# Altium schematic symbol library Capacitor - Ceramic - Sumsung.SchLib: 1421 symbols (part 3 of 8) (continued)
## CL10B561KC8WPNC (continued)
CAP CER 560PF 100V X7R 0603; Part Number: CL10B561KC8WPNC; Manufacturer: Samsung Electro-Mechanics; TemperatureRange: -55C ~ 125C; Tolerance: 10%; Value: 560pF; PartId: 30235; Supplier 1: Digi-Key; Supplier Part Number 1: 1276-6657-2-ND; ComponentLink1Description: Datasheet; ComponentLink1URL: http://www.samsungsem.com/kr/support/library/product-catalog/mlcc.jsp; ComponentLink2Description: Digi-Key Listing; ComponentLink2URL: https://www.digikey.com/product-detail/en/samsung-electro-mechanics/CL10B561KC8WPNC/1276-6657-2-ND/5961141; TemperatureCoefficient: X7R; Voltage: 100V; Price: 0; Device Package: 0603 (1608 Metric)
footprint CAP 0603/1608
pins: 1, 2

## CL10B562JB8NNNC
designator C?, comment 5600pF
CAP CER 5600PF 50V X7R 0603; Part Number: CL10B562JB8NNNC; Manufacturer: Samsung Electro-Mechanics America, Inc.; TemperatureRange: -55C ~ 125C; Tolerance: 5%; Value: 5600pF; PartId: 5537; Supplier 1: Digi-Key; Supplier Part Number 1: 1276-2090-2-ND; ComponentLink1Description: Datasheet; ComponentLink1URL: http://www.samsungsem.com/kr/support/product-search/mlcc/CL10B562JB8NNNC.jsp; ComponentLink2Description: Digi-Key listing; ComponentLink2URL: http://digikey.com/product-detail/en/CL10B562JB8NNNC/1276-2090-2-ND/3887748; TemperatureCoefficient: X7R; Voltage: 50V; Price: 0.0243; Type: -; Device Package: 0603 (1608 Metric)
footprint CAP 0603/1608
pins: 1, 2

## CL10B562KB8NNNC
designator C?, comment 5600pF
CAP CER 5600PF 50V X7R 0603; Part Number: CL10B562KB8NNNC; Manufacturer: Samsung Electro-Mechanics America, Inc.; TemperatureRange: -55C ~ 125C; Tolerance: 10%; Value: 5600pF; PartId: 5353; Supplier 1: Digi-Key; Supplier Part Number 1: 1276-2091-2-ND; ComponentLink1Description: Datasheet; ComponentLink1URL: http://www.samsungsem.com/kr/support/product-search/mlcc/CL10B562KB8NNNC.jsp; ComponentLink2Description: Digi-Key listing; ComponentLink2URL: http://digikey.com/product-detail/en/CL10B562KB8NNNC/1276-2091-2-ND/3887749; TemperatureCoefficient: X7R; Voltage: 50V; Price: 0.0097; Type: -; Device Package: 0603 (1608 Metric)
footprint CAP 0603/1608
pins: 1, 2

## CL10B563KA8NNNC
designator C?, comment 0.056uF
CAP CER 0.056UF 25V X7R 0603; Part Number: CL10B563KA8NNNC; Manufacturer: Samsung Electro-Mechanics America, Inc.; TemperatureRange: -55C ~ 125C; Tolerance: 10%; Value: 0.056uF; PartId: 5533; Supplier 1: Digi-Key; Supplier Part Number 1: 1276-2094-2-ND; ComponentLink1Description: Datasheet; ComponentLink1URL: http://www.samsungsem.com/kr/support/product-search/mlcc/CL10B563KA8NNNC.jsp; ComponentLink2Description: Digi-Key listing; ComponentLink2URL: http://digikey.com/product-detail/en/CL10B563KA8NNNC/1276-2094-2-ND/3887752; TemperatureCoefficient: X7R; Voltage: 25V; Price: 0.0239; Type: -; Device Package: 0603 (1608 Metric)
footprint CAP 0603/1608
pins: 1, 2

## CL10B563KB8NNNC
designator C?, comment 0.056uF
CAP CER 0.056UF 50V X7R 0603; Part Number: CL10B563KB8NNNC; Manufacturer: Samsung Electro-Mechanics America, Inc.; TemperatureRange: -55C ~ 125C; Tolerance: 10%; Value: 0.056uF; PartId: 5534; Supplier 1: Digi-Key; Supplier Part Number 1: 1276-2096-2-ND; ComponentLink1Description: Datasheet; ComponentLink1URL: http://www.samsungsem.com/kr/support/product-search/mlcc/CL10B563KB8NNNC.jsp; ComponentLink2Description: Digi-Key listing; ComponentLink2URL: http://digikey.com/product-detail/en/CL10B563KB8NNNC/1276-2096-2-ND/3887754; TemperatureCoefficient: X7R; Voltage: 50V; Price: 0.0239; Type: -; Device Package: 0603 (1608 Metric)
footprint CAP 0603/1608
pins: 1, 2

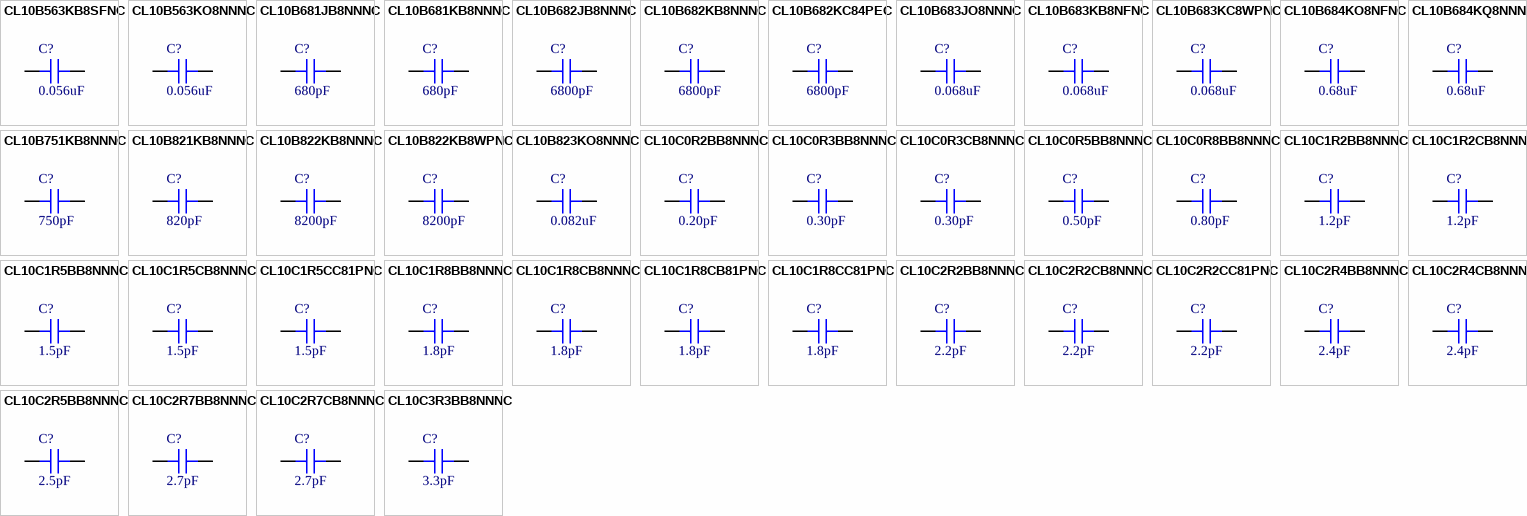
[diagram p11: symbols CL10B563KB8SFNC to CL10C3R3BB8NNNC]

## CL10B563KB8SFNC
designator C?, comment 0.056uF
CAP CER 0.056UF 50V X7R 0603; Part Number: CL10B563KB8SFNC; Manufacturer: Samsung Electro-Mechanics America, Inc.; TemperatureRange: -55C ~ 125C; Tolerance: 10%; Value: 0.056uF; PartId: 13452; Supplier 1: Digi-Key; Supplier Part Number 1: 1276-2097-2-ND; ComponentLink1Description: Datasheet; ComponentLink1URL: http://www.samsungsem.com/kr/support/product-search/mlcc/CL10B563KB8SFNC.jsp; ComponentLink2Description: Digi-Key Listing; ComponentLink2URL: https://www.digikey.com/product-detail/en/samsung-electro-mechanics-america-inc/CL10B563KB8SFNC/1276-2097-2-ND/3887755; TemperatureCoefficient: X7R; Voltage: 50V; Price: 0.0225; Device Package: 0603 (1608 Metric)
footprint CAP 0603/1608
pins: 1, 2

## CL10B563KO8NNNC
designator C?, comment 0.056uF
CAP CER 0.056UF 16V X7R 0603; Part Number: CL10B563KO8NNNC; Manufacturer: Samsung Electro-Mechanics America, Inc.; TemperatureRange: -55C ~ 125C; Tolerance: 10%; Value: 0.056uF; PartId: 5535; Supplier 1: Digi-Key; Supplier Part Number 1: 1276-2098-2-ND; ComponentLink1Description: Datasheet; ComponentLink1URL: http://www.samsungsem.com/kr/support/product-search/mlcc/CL10B563KO8NNNC.jsp; ComponentLink2Description: Digi-Key listing; ComponentLink2URL: http://digikey.com/product-detail/en/CL10B563KO8NNNC/1276-2098-2-ND/3887756; TemperatureCoefficient: X7R; Voltage: 16V; Price: 0.0239; Type: -; Device Package: 0603 (1608 Metric)
footprint CAP 0603/1608
pins: 1, 2

## CL10B681JB8NNNC
designator C?, comment 680pF
CAP CER 680PF 50V X7R 0603; Part Number: CL10B681JB8NNNC; Manufacturer: Samsung Electro-Mechanics America, Inc.; TemperatureRange: -55C ~ 125C; Tolerance: 5%; Value: 680pF; PartId: 5449; Supplier 1: Digi-Key; Supplier Part Number 1: 1276-1279-2-ND; ComponentLink1Description: Datasheet; ComponentLink1URL: http://www.samsungsem.com/kr/support/product-search/mlcc/CL10B681JB8NNNC.jsp; ComponentLink2Description: Digi-Key listing; ComponentLink2URL: http://digikey.com/product-detail/en/CL10B681JB8NNNC/1276-1279-2-ND/3886937; TemperatureCoefficient: X7R; Voltage: 50V; Price: 0.0153; Type: -; Device Package: 0603 (1608 Metric)
footprint CAP 0603/1608
pins: 1, 2

## CL10B681KB8NNNC
designator C?, comment 680pF
CAP CER 680PF 50V X7R 0603; Part Number: CL10B681KB8NNNC; Manufacturer: Samsung Electro-Mechanics America, Inc.; TemperatureRange: -55C ~ 125C; Tolerance: 10%; Value: 680pF; PartId: 5326; Supplier 1: Digi-Key; Supplier Part Number 1: 1276-1080-2-ND; ComponentLink1Description: Datasheet; ComponentLink1URL: http://www.samsungsem.com/kr/support/product-search/mlcc/CL10B681KB8NNNC.jsp; ComponentLink2Description: Digi-Key listing; ComponentLink2URL: http://digikey.com/product-detail/en/CL10B681KB8NNNC/1276-1080-2-ND/3886738; TemperatureCoefficient: X7R; Voltage: 50V; Price: 0.0086; Type: -; Device Package: 0603 (1608 Metric)
footprint CAP 0603/1608
pins: 1, 2

## CL10B682JB8NNNC
designator C?, comment 6800pF
CAP CER 6800PF 50V X7R 0603; Part Number: CL10B682JB8NNNC; Manufacturer: Samsung Electro-Mechanics America, Inc.; TemperatureRange: -55C ~ 125C; Tolerance: 5%; Value: 6800pF; PartId: 5415; Supplier 1: Digi-Key; Supplier Part Number 1: 1276-2099-2-ND; ComponentLink1Description: Datasheet; ComponentLink1URL: http://www.samsungsem.com/kr/support/product-search/mlcc/CL10B682JB8NNNC.jsp; ComponentLink2Description: Digi-Key listing; ComponentLink2URL: http://digikey.com/product-detail/en/CL10B682JB8NNNC/1276-2099-2-ND/3887757; TemperatureCoefficient: X7R; Voltage: 50V; Price: 0.013; Type: -; Device Package: 0603 (1608 Metric)
footprint CAP 0603/1608
pins: 1, 2

## CL10B682KB8NNNC
designator C?, comment 6800pF
CAP CER 6800PF 50V X7R 0603; Part Number: CL10B682KB8NNNC; Manufacturer: Samsung Electro-Mechanics America, Inc.; TemperatureRange: -55C ~ 125C; Tolerance: 10%; Value: 6800pF; PartId: 5344; Supplier 1: Digi-Key; Supplier Part Number 1: 1276-1185-2-ND; ComponentLink1Description: Datasheet; ComponentLink1URL: http://www.samsungsem.com/kr/support/product-search/mlcc/CL10B682KB8NNNC.jsp; ComponentLink2Description: Digi-Key listing; ComponentLink2URL: http://digikey.com/product-detail/en/CL10B682KB8NNNC/1276-1185-2-ND/3886843; TemperatureCoefficient: X7R; Voltage: 50V; Price: 0.0097; Type: -; Device Package: 0603 (1608 Metric)
footprint CAP 0603/1608
pins: 1, 2

## CL10B682KC84PEC
designator C?, comment 6800pF
CAP CER 6800PF 100V X7R 0603; Part Number: CL10B682KC84PEC; Manufacturer: Samsung Electro-Mechanics; TemperatureRange: -55C ~ 125C; Tolerance: 10%; Value: 6800pF; PartId: 30453; Supplier 1: Digi-Key; Supplier Part Number 1: 1276-6548-2-ND; ComponentLink1Description: Datasheet; ComponentLink1URL: http://www.samsungsem.com/kr/support/library/product-catalog/mlcc.jsp; ComponentLink2Description: Digi-Key Listing; ComponentLink2URL: https://www.digikey.com/product-detail/en/samsung-electro-mechanics/CL10B682KC84PEC/1276-6548-2-ND/5961032; TemperatureCoefficient: X7R; Voltage: 100V; Price: 0; Device Package: 0603 (1608 Metric)
footprint CAP 0603/1608
pins: 1, 2

## CL10B683JO8NNNC
designator C?, comment 0.068uF
CAP CER 0.068UF 16V X7R 0603; Part Number: CL10B683JO8NNNC; Manufacturer: Samsung Electro-Mechanics America, Inc.; TemperatureRange: -55C ~ 125C; Tolerance: 5%; Value: 0.068uF; PartId: 5599; Supplier 1: Digi-Key; Supplier Part Number 1: 1276-2104-2-ND; ComponentLink1Description: Datasheet; ComponentLink1URL: http://media.digikey.com/pdf/Data%20Sheets/Samsung%20PDFs/CL10B683JO8NNNC_spec.pdf; ComponentLink2Description: Digi-Key listing; ComponentLink2URL: http://digikey.com/product-detail/en/CL10B683JO8NNNC/1276-2104-2-ND/3887762; TemperatureCoefficient: X7R; Voltage: 16V; Price: 0.0324; Type: -; Device Package: 0603 (1608 Metric)
footprint CAP 0603/1608
pins: 1, 2

## CL10B683KB8NFNC
designator C?, comment 0.068uF
CAP CER 0.068UF 50V X7R 0603; Part Number: CL10B683KB8NFNC; Manufacturer: Samsung Electro-Mechanics; TemperatureRange: -55C ~ 125C; Tolerance: 10%; Value: 0.068uF; PartId: 30368; Supplier 1: Digi-Key; Supplier Part Number 1: 1276-2108-2-ND; ComponentLink1Description: Datasheet; ComponentLink1URL: http://www.samsungsem.com/kr/support/product-search/mlcc/CL10B683KB8NFNC.jsp; ComponentLink2Description: Digi-Key Listing; ComponentLink2URL: https://www.digikey.com/product-detail/en/samsung-electro-mechanics/CL10B683KB8NFNC/1276-2108-2-ND/3887766; TemperatureCoefficient: X7R; Voltage: 50V; Price: 0; Device Package: 0603 (1608 Metric)
footprint CAP 0603/1608
pins: 1, 2

## CL10B683KC8WPNC
designator C?, comment 0.068uF
CAP CER 0.068UF 100V X7R 0603; Part Number: CL10B683KC8WPNC; Manufacturer: Samsung Electro-Mechanics; TemperatureRange: -55C ~ 125C; Tolerance: 10%; Value: 0.068uF; PartId: 30727; Supplier 1: Digi-Key; Supplier Part Number 1: 1276-6682-2-ND; ComponentLink1Description: Datasheet; ComponentLink1URL: http://www.samsungsem.com/kr/support/product-search/mlcc/CL10B683KC8WPNC.jsp; ComponentLink2Description: Digi-Key Listing; ComponentLink2URL: https://www.digikey.com/product-detail/en/samsung-electro-mechanics/CL10B683KC8WPNC/1276-6682-2-ND/5961166; TemperatureCoefficient: X7R; Voltage: 100V; Price: 0; Device Package: 0603 (1608 Metric)
footprint CAP 0603/1608
pins: 1, 2

## CL10B684KO8NFNC
designator C?, comment 0.68uF
CAP CER 0.68UF 16V X7R 0603; Part Number: CL10B684KO8NFNC; Manufacturer: Samsung Electro-Mechanics; TemperatureRange: -55C ~ 125C; Tolerance: 10%; Value: 0.68uF; PartId: 30751; Supplier 1: Digi-Key; Supplier Part Number 1: 1276-2114-2-ND; ComponentLink1Description: Datasheet; ComponentLink1URL: http://www.samsungsem.com/kr/support/product-search/mlcc/CL10B684KO8NFNC.jsp; ComponentLink2Description: Digi-Key Listing; ComponentLink2URL: https://www.digikey.com/product-detail/en/samsung-electro-mechanics/CL10B684KO8NFNC/1276-2114-2-ND/3887772; TemperatureCoefficient: X7R; Voltage: 16V; Price: 0; Device Package: 0603 (1608 Metric)
footprint CAP 0603/1608
pins: 1, 2

## CL10B684KQ8NNNC
designator C?, comment 0.68uF
CAP CER 0.68UF 6.3V X7R 0603; Part Number: CL10B684KQ8NNNC; Manufacturer: Samsung Electro-Mechanics America, Inc.; TemperatureRange: -55C ~ 125C; Tolerance: 10%; Value: 0.68uF; PartId: 5588; Supplier 1: Digi-Key; Supplier Part Number 1: 1276-2115-2-ND; ComponentLink1Description: Datasheet; ComponentLink1URL: http://www.samsungsem.com/kr/support/product-search/mlcc/CL10B684KQ8NNNC.jsp; ComponentLink2Description: Digi-Key listing; ComponentLink2URL: http://digikey.com/product-detail/en/CL10B684KQ8NNNC/1276-2115-2-ND/3887773; TemperatureCoefficient: X7R; Voltage: 6.3V; Price: 0.0308; Type: -; Device Package: 0603 (1608 Metric)
footprint CAP 0603/1608
pins: 1, 2

## CL10B751KB8NNNC
designator C?, comment 750pF
CAP CER 750PF 50V X7R 0603; Part Number: CL10B751KB8NNNC; Manufacturer: Samsung Electro-Mechanics America, Inc.; TemperatureRange: -55C ~ 125C; Tolerance: 10%; Value: 750pF; PartId: 5246; Supplier 1: Digi-Key; Supplier Part Number 1: 1276-2116-2-ND; ComponentLink1Description: Datasheet; ComponentLink1URL: http://www.samsungsem.com/kr/support/product-search/mlcc/CL10B751KB8NNNC.jsp; ComponentLink2Description: Digi-Key listing; ComponentLink2URL: http://digikey.com/product-detail/en/CL10B751KB8NNNC/1276-2116-2-ND/3887774; TemperatureCoefficient: X7R; Voltage: 50V; Price: 0.0032; Type: -; Device Package: 0603 (1608 Metric)
footprint CAP 0603/1608
pins: 1, 2

## CL10B821KB8NNNC
designator C?, comment 820pF
CAP CER 820PF 50V X7R 0603; Part Number: CL10B821KB8NNNC; Manufacturer: Samsung Electro-Mechanics America, Inc.; TemperatureRange: -55C ~ 125C; Tolerance: 10%; Value: 820pF; PartId: 5349; Supplier 1: Digi-Key; Supplier Part Number 1: 1276-2117-2-ND; ComponentLink1Description: Datasheet; ComponentLink1URL: http://www.samsungsem.com/kr/support/product-search/mlcc/CL10B821KB8NNNC.jsp; ComponentLink2Description: Digi-Key listing; ComponentLink2URL: http://digikey.com/product-detail/en/CL10B821KB8NNNC/1276-2117-2-ND/3887775; TemperatureCoefficient: X7R; Voltage: 50V; Price: 0.0097; Type: -; Device Package: 0603 (1608 Metric)
footprint CAP 0603/1608
pins: 1, 2

## CL10B822KB8NNNC
designator C?, comment 8200pF
CAP CER 8200PF 50V X7R 0603; Part Number: CL10B822KB8NNNC; Manufacturer: Samsung Electro-Mechanics America, Inc.; TemperatureRange: -55C ~ 125C; Tolerance: 10%; Value: 8200pF; PartId: 5347; Supplier 1: Digi-Key; Supplier Part Number 1: 1276-2119-2-ND; ComponentLink1Description: Datasheet; ComponentLink1URL: http://www.samsungsem.com/kr/support/product-search/mlcc/CL10B822KB8NNNC.jsp; ComponentLink2Description: Digi-Key listing; ComponentLink2URL: http://digikey.com/product-detail/en/CL10B822KB8NNNC/1276-2119-2-ND/3887777; TemperatureCoefficient: X7R; Voltage: 50V; Price: 0.0097; Type: -; Device Package: 0603 (1608 Metric)
footprint CAP 0603/1608
pins: 1, 2

## CL10B822KB8WPNC
designator C?, comment 8200pF
CAP CER 8200PF 50V X7R 0603; Part Number: CL10B822KB8WPNC; Manufacturer: Samsung Electro-Mechanics; TemperatureRange: -55C ~ 125C; Tolerance: 10%; Value: 8200pF; PartId: 30301; Supplier 1: Digi-Key; Supplier Part Number 1: 1276-6533-2-ND; ComponentLink1Description: Datasheet; ComponentLink1URL: http://www.samsungsem.com/kr/support/product-search/mlcc/CL10B822KB8WPNC.jsp; ComponentLink2Description: Digi-Key Listing; ComponentLink2URL: https://www.digikey.com/product-detail/en/samsung-electro-mechanics/CL10B822KB8WPNC/1276-6533-2-ND/5961017; TemperatureCoefficient: X7R; Voltage: 50V; Price: 0; Device Package: 0603 (1608 Metric)
footprint CAP 0603/1608
pins: 1, 2

## CL10B823KO8NNNC
designator C?, comment 0.082uF
CAP CER 0.082UF 16V X7R 0603; Part Number: CL10B823KO8NNNC; Manufacturer: Samsung Electro-Mechanics America, Inc.; TemperatureRange: -55C ~ 125C; Tolerance: 10%; Value: 0.082uF; PartId: 5545; Supplier 1: Digi-Key; Supplier Part Number 1: 1276-2123-2-ND; ComponentLink1Description: Datasheet; ComponentLink1URL: http://www.samsungsem.com/kr/support/product-search/mlcc/CL10B823KO8NNNC.jsp; ComponentLink2Description: Digi-Key listing; ComponentLink2URL: http://digikey.com/product-detail/en/CL10B823KO8NNNC/1276-2123-2-ND/3887781; TemperatureCoefficient: X7R; Voltage: 16V; Price: 0.0247; Type: -; Device Package: 0603 (1608 Metric)
footprint CAP 0603/1608
pins: 1, 2

## CL10C0R2BB8NNNC
designator C?, comment 0.20pF
CAP CER 0.2PF 50V NP0 0603; Part Number: CL10C0R2BB8NNNC; Manufacturer: Samsung Electro-Mechanics America, Inc.; TemperatureRange: -55C ~ 125C; TemperatureCoefficient: C0G, NP0; Tolerance: 0.1pF; Value: 0.20pF; PartId: 5249; Supplier 1: Digi-Key; Supplier Part Number 1: 1276-2144-2-ND; ComponentLink1Description: Datasheet; ComponentLink1URL: http://www.samsungsem.com/kr/support/product-search/mlcc/CL10C0R2BB8NNNC.jsp; ComponentLink2Description: Digi-Key listing; ComponentLink2URL: http://digikey.com/product-detail/en/CL10C0R2BB8NNNC/1276-2144-2-ND/3887802; Voltage: 50V; Price: 0.0034; Type: -; Device Package: 0603 (1608 Metric)
footprint CAP 0603/1608
pins: 1, 2

## CL10C0R3BB8NNNC
designator C?, comment 0.30pF
CAP CER 0.30PF 50V NP0 0603; Part Number: CL10C0R3BB8NNNC; Manufacturer: Samsung Electro-Mechanics America, Inc.; TemperatureRange: -55C ~ 125C; TemperatureCoefficient: C0G, NP0; Tolerance: 0.1pF; Value: 0.30pF; PartId: 5247; Supplier 1: Digi-Key; Supplier Part Number 1: 1276-2145-2-ND; ComponentLink1Description: Datasheet; ComponentLink1URL: http://www.samsungsem.com/kr/support/product-search/mlcc/CL10C0R3BB8NNNC.jsp; ComponentLink2Description: Digi-Key listing; ComponentLink2URL: http://digikey.com/product-detail/en/CL10C0R3BB8NNNC/1276-2145-2-ND/3887803; Voltage: 50V; Price: 0.0034; Type: -; Device Package: 0603 (1608 Metric)
footprint CAP 0603/1608
pins: 1, 2

## CL10C0R3CB8NNNC
designator C?, comment 0.30pF
CAP CER 0.30PF 50V NP0 0603; Part Number: CL10C0R3CB8NNNC; Manufacturer: Samsung Electro-Mechanics America, Inc.; TemperatureRange: -55C ~ 125C; TemperatureCoefficient: C0G, NP0; Tolerance: 0.25pF; Value: 0.30pF; PartId: 5279; Supplier 1: Digi-Key; Supplier Part Number 1: 1276-2146-2-ND; ComponentLink1Description: Datasheet; ComponentLink1URL: http://www.samsungsem.com/kr/support/product-search/mlcc/CL10C0R3CB8NNNC.jsp; ComponentLink2Description: Digi-Key listing; ComponentLink2URL: http://digikey.com/product-detail/en/CL10C0R3CB8NNNC/1276-2146-2-ND/3887804; Voltage: 50V; Price: 0.0064; Type: -; Device Package: 0603 (1608 Metric)
footprint CAP 0603/1608
pins: 1, 2

## CL10C0R5BB8NNNC
designator C?, comment 0.50pF
CAP CER 0.50PF 50V NP0 0603; Part Number: CL10C0R5BB8NNNC; Manufacturer: Samsung Electro-Mechanics America, Inc.; TemperatureRange: -55C ~ 125C; TemperatureCoefficient: C0G, NP0; Tolerance: 0.1pF; Value: 0.50pF; PartId: 5406; Supplier 1: Digi-Key; Supplier Part Number 1: 1276-1818-2-ND; ComponentLink1Description: Datasheet; ComponentLink1URL: http://www.samsungsem.com/kr/support/product-search/mlcc/CL10C0R5BB8NNNC.jsp; ComponentLink2Description: Digi-Key listing; ComponentLink2URL: http://digikey.com/product-detail/en/CL10C0R5BB8NNNC/1276-1818-2-ND/3887476; Voltage: 50V; Price: 0.0117; Type: -; Device Package: 0603 (1608 Metric)
footprint CAP 0603/1608
pins: 1, 2

## CL10C0R8BB8NNNC
designator C?, comment 0.80pF
CAP CER 0.8PF 50V NP0 0603; Part Number: CL10C0R8BB8NNNC; Manufacturer: Samsung Electro-Mechanics America, Inc.; TemperatureRange: -55C ~ 125C; TemperatureCoefficient: C0G, NP0; Tolerance: 0.1pF; Value: 0.80pF; PartId: 13128; Supplier 1: Digi-Key; Supplier Part Number 1: 1276-2148-2-ND; ComponentLink1Description: Datasheet; ComponentLink1URL: http://www.samsungsem.com/kr/support/product-search/mlcc/CL10C0R8BB8NNNC.jsp; ComponentLink2Description: Digi-Key Listing; ComponentLink2URL: https://www.digikey.com/product-detail/en/samsung-electro-mechanics-america-inc/CL10C0R8BB8NNNC/1276-2148-2-ND/3887806; Voltage: 50V; Price: 0.0029; Device Package: 0603 (1608 Metric)
footprint CAP 0603/1608
pins: 1, 2

## CL10C1R2BB8NNNC
designator C?, comment 1.2pF
CAP CER 1.2PF 50V NP0 0603; Part Number: CL10C1R2BB8NNNC; Manufacturer: Samsung Electro-Mechanics America, Inc.; TemperatureRange: -55C ~ 125C; TemperatureCoefficient: C0G, NP0; Tolerance: 0.1pF; Value: 1.2pF; PartId: 5259; Supplier 1: Digi-Key; Supplier Part Number 1: 1276-1759-2-ND; ComponentLink1Description: Datasheet; ComponentLink1URL: http://www.samsungsem.com/kr/support/product-search/mlcc/CL10C1R2BB8NNNC.jsp; ComponentLink2Description: Digi-Key listing; ComponentLink2URL: http://digikey.com/product-detail/en/CL10C1R2BB8NNNC/1276-1759-2-ND/3887417; Voltage: 50V; Price: 0.0037; Type: -; Device Package: 0603 (1608 Metric)
footprint CAP 0603/1608
pins: 1, 2

## CL10C1R2CB8NNNC
designator C?, comment 1.2pF
CAP CER 1.2PF 50V NP0 0603; Part Number: CL10C1R2CB8NNNC; Manufacturer: Samsung Electro-Mechanics America, Inc.; TemperatureRange: -55C ~ 125C; TemperatureCoefficient: C0G, NP0; Tolerance: 0.25pF; Value: 1.2pF; PartId: 5367; Supplier 1: Digi-Key; Supplier Part Number 1: 1276-1186-2-ND; ComponentLink1Description: Datasheet; ComponentLink1URL: http://www.samsungsem.com/kr/support/product-search/mlcc/CL10C1R2CB8NNNC.jsp; ComponentLink2Description: Digi-Key listing; ComponentLink2URL: http://digikey.com/product-detail/en/CL10C1R2CB8NNNC/1276-1186-2-ND/3886844; Voltage: 50V; Price: 0.0102; Type: -; Device Package: 0603 (1608 Metric)
footprint CAP 0603/1608
pins: 1, 2

## CL10C1R5BB8NNNC
designator C?, comment 1.5pF
CAP CER 1.5PF 50V NP0 0603; Part Number: CL10C1R5BB8NNNC; Manufacturer: Samsung Electro-Mechanics America, Inc.; TemperatureRange: -55C ~ 125C; TemperatureCoefficient: C0G, NP0; Tolerance: 0.1pF; Value: 1.5pF; PartId: 5241; Supplier 1: Digi-Key; Supplier Part Number 1: 1276-1071-2-ND; ComponentLink1Description: Datasheet; ComponentLink1URL: http://www.samsungsem.com/kr/support/product-search/mlcc/CL10C1R5BB8NNNC.jsp; ComponentLink2Description: Digi-Key listing; ComponentLink2URL: http://digikey.com/product-detail/en/CL10C1R5BB8NNNC/1276-1071-2-ND/3886729; Voltage: 50V; Price: 0.0029; Type: -; Device Package: 0603 (1608 Metric)
footprint CAP 0603/1608
pins: 1, 2

## CL10C1R5CB8NNNC
designator C?, comment 1.5pF
CAP CER 1.5PF 50V NP0 0603; Part Number: CL10C1R5CB8NNNC; Manufacturer: Samsung Electro-Mechanics America, Inc.; TemperatureRange: -55C ~ 125C; TemperatureCoefficient: C0G, NP0; Tolerance: 0.25pF; Value: 1.5pF; PartId: 5374; Supplier 1: Digi-Key; Supplier Part Number 1: 1276-1819-2-ND; ComponentLink1Description: Datasheet; ComponentLink1URL: http://www.samsungsem.com/kr/support/product-search/mlcc/CL10C1R5CB8NNNC.jsp; ComponentLink2Description: Digi-Key listing; ComponentLink2URL: http://digikey.com/product-detail/en/CL10C1R5CB8NNNC/1276-1819-2-ND/3887477; Voltage: 50V; Price: 0.0102; Type: -; Device Package: 0603 (1608 Metric)
footprint CAP 0603/1608
pins: 1, 2

## CL10C1R5CC81PNC
designator C?, comment 1.5pF
CAP CER 1.5PF 100V C0G/NP0 0603; Part Number: CL10C1R5CC81PNC; Manufacturer: Samsung Electro-Mechanics; TemperatureRange: -55C ~ 125C; TemperatureCoefficient: C0G, NP0; Tolerance: 0.25pF; Value: 1.5pF; PartId: 30832; Supplier 1: Digi-Key; Supplier Part Number 1: 1276-6627-2-ND; ComponentLink1Description: Datasheet; ComponentLink1URL: http://www.samsungsem.com/kr/support/library/product-catalog/mlcc.jsp; ComponentLink2Description: Digi-Key Listing; ComponentLink2URL: https://www.digikey.com/product-detail/en/samsung-electro-mechanics/CL10C1R5CC81PNC/1276-6627-2-ND/5961111; Voltage: 100V; Price: 0; Device Package: 0603 (1608 Metric)
footprint CAP 0603/1608
pins: 1, 2

## CL10C1R8BB8NNNC
designator C?, comment 1.8pF
CAP CER 1.8PF 50V NP0 0603; Part Number: CL10C1R8BB8NNNC; Manufacturer: Samsung Electro-Mechanics America, Inc.; TemperatureRange: -55C ~ 125C; TemperatureCoefficient: C0G, NP0; Tolerance: 0.1pF; Value: 1.8pF; PartId: 5261; Supplier 1: Digi-Key; Supplier Part Number 1: 1276-1127-2-ND; ComponentLink1Description: Datasheet; ComponentLink1URL: http://www.samsungsem.com/kr/support/product-search/mlcc/CL10C1R8BB8NNNC.jsp; ComponentLink2Description: Digi-Key listing; ComponentLink2URL: http://digikey.com/product-detail/en/CL10C1R8BB8NNNC/1276-1127-2-ND/3886785; Voltage: 50V; Price: 0.0041; Type: -; Device Package: 0603 (1608 Metric)
footprint CAP 0603/1608
pins: 1, 2

## CL10C1R8CB8NNNC
designator C?, comment 1.8pF
CAP CER 1.8PF 50V NP0 0603; Part Number: CL10C1R8CB8NNNC; Manufacturer: Samsung Electro-Mechanics America, Inc.; TemperatureRange: -55C ~ 125C; TemperatureCoefficient: C0G, NP0; Tolerance: 0.25pF; Value: 1.8pF; PartId: 5375; Supplier 1: Digi-Key; Supplier Part Number 1: 1276-2218-2-ND; ComponentLink1Description: Datasheet; ComponentLink1URL: http://www.samsungsem.com/kr/support/product-search/mlcc/CL10C1R8CB8NNNC.jsp; ComponentLink2Description: Digi-Key listing; ComponentLink2URL: http://digikey.com/product-detail/en/CL10C1R8CB8NNNC/1276-2218-2-ND/3887876; Voltage: 50V; Price: 0.0102; Type: -; Device Package: 0603 (1608 Metric)
footprint CAP 0603/1608
pins: 1, 2

## CL10C1R8CB81PNC
designator C?, comment 1.8pF
CAP CER 1.8PF 50V C0G/NP0 0603; Part Number: CL10C1R8CB81PNC; Manufacturer: Samsung Electro-Mechanics; TemperatureRange: -55C ~ 125C; TemperatureCoefficient: C0G, NP0; Tolerance: 0.25pF; Value: 1.8pF; PartId: 30459; Supplier 1: Digi-Key; Supplier Part Number 1: 1276-6539-2-ND; ComponentLink1Description: Datasheet; ComponentLink1URL: http://www.samsungsem.com/kr/support/product-search/mlcc/CL10C1R8CB81PNC.jsp; ComponentLink2Description: Digi-Key Listing; ComponentLink2URL: https://www.digikey.com/product-detail/en/samsung-electro-mechanics/CL10C1R8CB81PNC/1276-6539-2-ND/5961023; Voltage: 50V; Price: 0; Device Package: 0603 (1608 Metric)
footprint CAP 0603/1608
pins: 1, 2

## CL10C1R8CC81PNC
designator C?, comment 1.8pF
CAP CER 1.8PF 100V C0G/NP0 0603; Part Number: CL10C1R8CC81PNC; Manufacturer: Samsung Electro-Mechanics; TemperatureRange: -55C ~ 125C; TemperatureCoefficient: C0G, NP0; Tolerance: 0.25pF; Value: 1.8pF; PartId: 30833; Supplier 1: Digi-Key; Supplier Part Number 1: 1276-6628-2-ND; ComponentLink1Description: Datasheet; ComponentLink1URL: http://www.samsungsem.com/kr/support/product-search/mlcc/CL10C1R8CC81PNC.jsp; ComponentLink2Description: Digi-Key Listing; ComponentLink2URL: https://www.digikey.com/product-detail/en/samsung-electro-mechanics/CL10C1R8CC81PNC/1276-6628-2-ND/5961112; Voltage: 100V; Price: 0; Device Package: 0603 (1608 Metric)
footprint CAP 0603/1608
pins: 1, 2

## CL10C2R2BB8NNNC
designator C?, comment 2.2pF
CAP CER 2.2PF 50V NP0 0603; Part Number: CL10C2R2BB8NNNC; Manufacturer: Samsung Electro-Mechanics America, Inc.; TemperatureRange: -55C ~ 125C; TemperatureCoefficient: C0G, NP0; Tolerance: 0.1pF; Value: 2.2pF; PartId: 5363; Supplier 1: Digi-Key; Supplier Part Number 1: 1276-1084-2-ND; ComponentLink1Description: Datasheet; ComponentLink1URL: http://www.samsungsem.com/kr/support/product-search/mlcc/CL10C2R2BB8NNNC.jsp; ComponentLink2Description: Digi-Key listing; ComponentLink2URL: http://digikey.com/product-detail/en/CL10C2R2BB8NNNC/1276-1084-2-ND/3886742; Voltage: 50V; Price: 0.0102; Type: -; Device Package: 0603 (1608 Metric)
footprint CAP 0603/1608
pins: 1, 2

## CL10C2R2CB8NNNC
designator C?, comment 2.2pF
CAP CER 2.2PF 50V NP0 0603; Part Number: CL10C2R2CB8NNNC; Manufacturer: Samsung Electro-Mechanics America, Inc.; TemperatureRange: -55C ~ 125C; TemperatureCoefficient: C0G, NP0; Tolerance: 0.25pF; Value: 2.2pF; PartId: 5362; Supplier 1: Digi-Key; Supplier Part Number 1: 1276-1281-2-ND; ComponentLink1Description: Datasheet; ComponentLink1URL: http://www.samsungsem.com/kr/support/product-search/mlcc/CL10C2R2CB8NNNC.jsp; ComponentLink2Description: Digi-Key listing; ComponentLink2URL: http://digikey.com/product-detail/en/CL10C2R2CB8NNNC/1276-1281-2-ND/3886939; Voltage: 50V; Price: 0.0102; Type: -; Device Package: 0603 (1608 Metric)
footprint CAP 0603/1608
pins: 1, 2

## CL10C2R2CC81PNC
designator C?, comment 2.2pF
CAP CER 2.2PF 100V C0G/NP0 0603; Part Number: CL10C2R2CC81PNC; Manufacturer: Samsung Electro-Mechanics; TemperatureRange: -55C ~ 125C; TemperatureCoefficient: C0G, NP0; Tolerance: 0.25pF; Value: 2.2pF; PartId: 30834; Supplier 1: Digi-Key; Supplier Part Number 1: 1276-6629-2-ND; ComponentLink1Description: Datasheet; ComponentLink1URL: http://www.samsungsem.com/kr/support/product-search/mlcc/CL10C2R2CC81PNC.jsp; ComponentLink2Description: Digi-Key Listing; ComponentLink2URL: https://www.digikey.com/product-detail/en/samsung-electro-mechanics/CL10C2R2CC81PNC/1276-6629-2-ND/5961113; Voltage: 100V; Price: 0; Device Package: 0603 (1608 Metric)
footprint CAP 0603/1608
pins: 1, 2

## CL10C2R4BB8NNNC
designator C?, comment 2.4pF
CAP CER 2.4PF 50V NP0 0603; Part Number: CL10C2R4BB8NNNC; Manufacturer: Samsung Electro-Mechanics America, Inc.; TemperatureRange: -55C ~ 125C; TemperatureCoefficient: C0G, NP0; Tolerance: 0.1pF; Value: 2.4pF; PartId: 5268; Supplier 1: Digi-Key; Supplier Part Number 1: 1276-2254-2-ND; ComponentLink1Description: Datasheet; ComponentLink1URL: http://www.samsungsem.com/kr/support/product-search/mlcc/CL10C2R4BB8NNNC.jsp; ComponentLink2Description: Digi-Key listing; ComponentLink2URL: http://digikey.com/product-detail/en/CL10C2R4BB8NNNC/1276-2254-2-ND/3887912; Voltage: 50V; Price: 0.0043; Type: -; Device Package: 0603 (1608 Metric)
footprint CAP 0603/1608
pins: 1, 2

## CL10C2R4CB8NNNC
designator C?, comment 2.4pF
CAP CER 2.4PF 50V NP0 0603; Part Number: CL10C2R4CB8NNNC; Manufacturer: Samsung Electro-Mechanics America, Inc.; TemperatureRange: -55C ~ 125C; TemperatureCoefficient: C0G, NP0; Tolerance: 0.25pF; Value: 2.4pF; PartId: 5255; Supplier 1: Digi-Key; Supplier Part Number 1: 1276-2255-2-ND; ComponentLink1Description: Datasheet; ComponentLink1URL: http://www.samsungsem.com/kr/support/product-search/mlcc/CL10C2R4CB8NNNC.jsp; ComponentLink2Description: Digi-Key listing; ComponentLink2URL: http://digikey.com/product-detail/en/CL10C2R4CB8NNNC/1276-2255-2-ND/3887913; Voltage: 50V; Price: 0.0034; Type: -; Device Package: 0603 (1608 Metric)
footprint CAP 0603/1608
pins: 1, 2

## CL10C2R5BB8NNNC
designator C?, comment 2.5pF
CAP CER 2.5PF 50V NP0 0603; Part Number: CL10C2R5BB8NNNC; Manufacturer: Samsung Electro-Mechanics America, Inc.; TemperatureRange: -55C ~ 125C; TemperatureCoefficient: C0G, NP0; Tolerance: 0.1pF; Value: 2.5pF; PartId: 5272; Supplier 1: Digi-Key; Supplier Part Number 1: 1276-2256-2-ND; ComponentLink1Description: Datasheet; ComponentLink1URL: http://www.samsungsem.com/kr/support/product-search/mlcc/CL10C2R5BB8NNNC.jsp; ComponentLink2Description: Digi-Key listing; ComponentLink2URL: http://digikey.com/product-detail/en/CL10C2R5BB8NNNC/1276-2256-2-ND/3887914; Voltage: 50V; Price: 0.0049; Type: -; Device Package: 0603 (1608 Metric)
footprint CAP 0603/1608
pins: 1, 2

## CL10C2R7BB8NNNC
designator C?, comment 2.7pF
CAP CER 2.7PF 50V NP0 0603; Part Number: CL10C2R7BB8NNNC; Manufacturer: Samsung Electro-Mechanics America, Inc.; TemperatureRange: -55C ~ 125C; TemperatureCoefficient: C0G, NP0; Tolerance: 0.1pF; Value: 2.7pF; PartId: 5265; Supplier 1: Digi-Key; Supplier Part Number 1: 1276-1240-2-ND; ComponentLink1Description: Datasheet; ComponentLink1URL: http://www.samsungsem.com/kr/support/product-search/mlcc/CL10C2R7BB8NNNC.jsp; ComponentLink2Description: Digi-Key listing; ComponentLink2URL: http://digikey.com/product-detail/en/CL10C2R7BB8NNNC/1276-1240-2-ND/3886898; Voltage: 50V; Price: 0.0043; Type: -; Device Package: 0603 (1608 Metric)
footprint CAP 0603/1608
pins: 1, 2

## CL10C2R7CB8NNNC
designator C?, comment 2.7pF
CAP CER 2.7PF 50V NP0 0603; Part Number: CL10C2R7CB8NNNC; Manufacturer: Samsung Electro-Mechanics America, Inc.; TemperatureRange: -55C ~ 125C; TemperatureCoefficient: C0G, NP0; Tolerance: 0.25pF; Value: 2.7pF; PartId: 5371; Supplier 1: Digi-Key; Supplier Part Number 1: 1276-2258-2-ND; ComponentLink1Description: Datasheet; ComponentLink1URL: http://www.samsungsem.com/kr/support/product-search/mlcc/CL10C2R7CB8NNNC.jsp; ComponentLink2Description: Digi-Key listing; ComponentLink2URL: http://digikey.com/product-detail/en/CL10C2R7CB8NNNC/1276-2258-2-ND/3887916; Voltage: 50V; Price: 0.0102; Type: -; Device Package: 0603 (1608 Metric)
footprint CAP 0603/1608
pins: 1, 2

## CL10C3R3BB8NNNC
designator C?, comment 3.3pF
CAP CER 3.3PF 50V NP0 0603; Part Number: CL10C3R3BB8NNNC; Manufacturer: Samsung Electro-Mechanics America, Inc.; TemperatureRange: -55C ~ 125C; TemperatureCoefficient: C0G, NP0; Tolerance: 0.1pF; Value: 3.3pF; PartId: 5414; Supplier 1: Digi-Key; Supplier Part Number 1: 1276-1241-2-ND; ComponentLink1Description: Datasheet; ComponentLink1URL: http://www.samsungsem.com/kr/support/product-search/mlcc/CL10C3R3BB8NNNC.jsp; ComponentLink2Description: Digi-Key listing; ComponentLink2URL: http://digikey.com/product-detail/en/CL10C3R3BB8NNNC/1276-1241-2-ND/3886899; Voltage: 50V; Price: 0.0128; Type: -; Device Package: 0603 (1608 Metric)
footprint CAP 0603/1608
pins: 1, 2

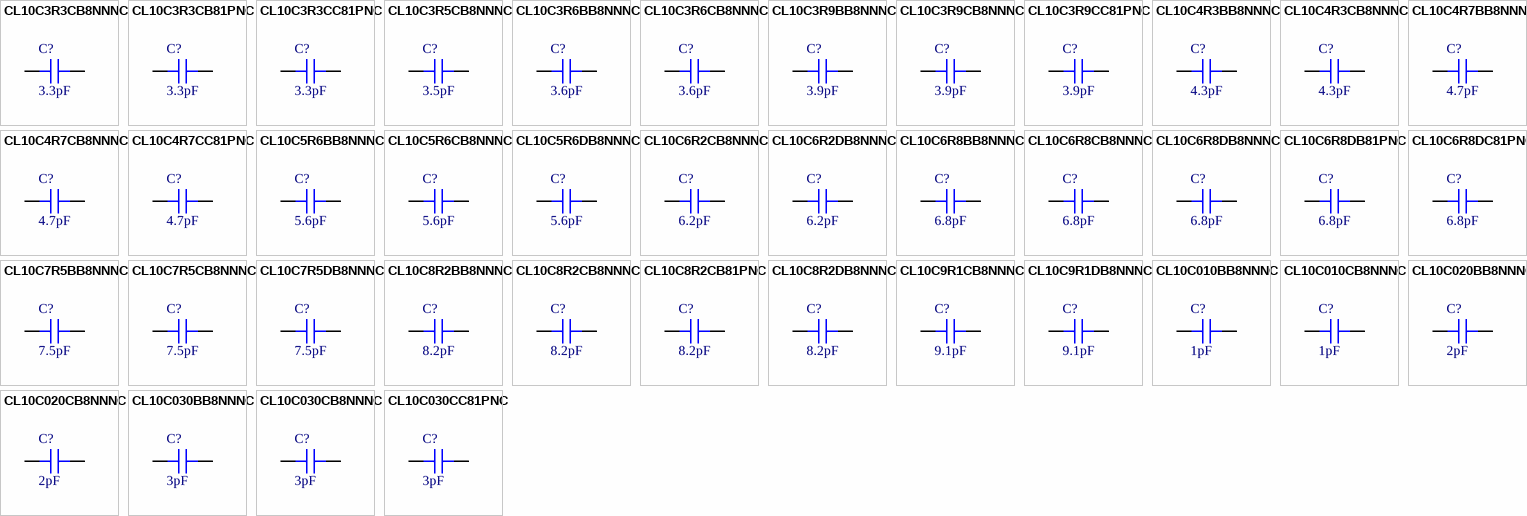
[diagram p12: symbols CL10C3R3CB8NNNC to CL10C030CC81PNC]

## CL10C3R3CB8NNNC
designator C?, comment 3.3pF
CAP CER 3.3PF 50V NP0 0603; Part Number: CL10C3R3CB8NNNC; Manufacturer: Samsung Electro-Mechanics America, Inc.; TemperatureRange: -55C ~ 125C; TemperatureCoefficient: C0G, NP0; Tolerance: 0.25pF; Value: 3.3pF; PartId: 5365; Supplier 1: Digi-Key; Supplier Part Number 1: 1276-1790-2-ND; ComponentLink1Description: Datasheet; ComponentLink1URL: http://www.samsungsem.com/kr/support/product-search/mlcc/CL10C3R3CB8NNNC.jsp; ComponentLink2Description: Digi-Key listing; ComponentLink2URL: http://digikey.com/product-detail/en/CL10C3R3CB8NNNC/1276-1790-2-ND/3887448; Voltage: 50V; Price: 0.0102; Type: -; Device Package: 0603 (1608 Metric)
footprint CAP 0603/1608
pins: 1, 2

## CL10C3R3CB81PNC
designator C?, comment 3.3pF